# Altium footprint library Connectors SMD.PcbLib: 130 footprints (part 10 of 12)
Each footprint in its own frame and in the unit in brackets; x right, y up, seen from the top. Pads: shape width x height; smd on the part's side, far side on the other; paste and mask are expansions set on the pad; w line width, h text height; cw(c..) or ccw(c..) is an arc to the next point about the centre after c.
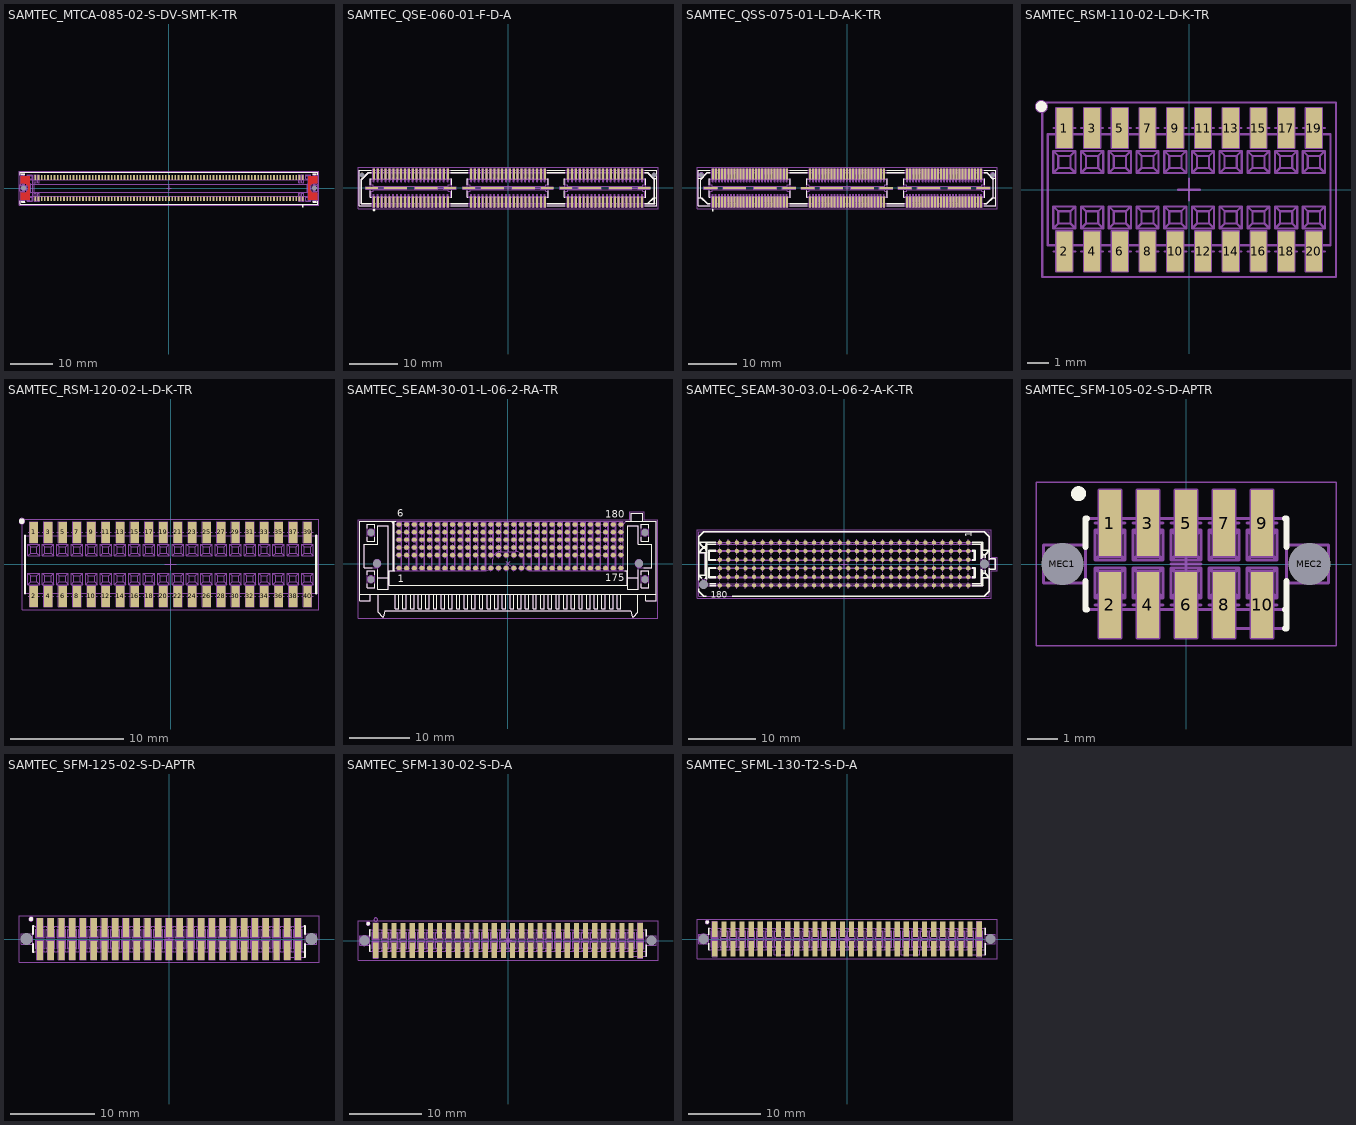
[diagram p9: the footprints below, top view; thin cyan lines are the x and y axes]

## SAMTEC_MTCA-085-02-S-DV-SMT-K-TR [mm] "170 Contacts, Pitch 0.75mm, Micro TCA Connector"
height 12.85
pads (172):
  rect 0.4x1.15 smd mask+0: 1(31.5,-2.5) 2(30.75,-2.5) 3(30,-2.5) 4(29.25,-2.5) 5(28.5,-2.5) 6(27.75,-2.5) 7(27,-2.5) 8(26.25,-2.5) 9(25.5,-2.5) 10(24.75,-2.5) 11(24,-2.5) 12(23.25,-2.5) 13(22.5,-2.5) 14(21.75,-2.5) 15(21,-2.5) 16(20.25,-2.5) 17(19.5,-2.5) 18(18.75,-2.5) 19(18,-2.5) 20(17.25,-2.5) 21(16.5,-2.5) 22(15.75,-2.5) 23(15,-2.5) 24(14.25,-2.5) 25(13.5,-2.5) 26(12.75,-2.5) 27(12,-2.5) 28(11.25,-2.5) 29(10.5,-2.5) 30(9.75,-2.5) 31(9,-2.5) 32(8.25,-2.5) 33(7.5,-2.5) 34(6.75,-2.5) 35(6,-2.5) 36(5.25,-2.5) 37(4.5,-2.5) 38(3.75,-2.5) 39(3,-2.5) 40(2.25,-2.5) 41(1.5,-2.5) 42(0.75,-2.5) 43(0,-2.5) 44(-0.75,-2.5) 45(-1.5,-2.5) 46(-2.25,-2.5) 47(-3,-2.5) 48(-3.75,-2.5) 49(-4.5,-2.5) 50(-5.25,-2.5) 51(-6,-2.5) 52(-6.75,-2.5) 53(-7.5,-2.5) 54(-8.25,-2.5) 55(-9,-2.5) 56(-9.75,-2.5) 57(-10.5,-2.5) 58(-11.25,-2.5) 59(-12,-2.5) 60(-12.75,-2.5) 61(-13.5,-2.5) 62(-14.25,-2.5) 63(-15,-2.5) 64(-15.75,-2.5) 65(-16.5,-2.5) 66(-17.25,-2.5) 67(-18,-2.5) 68(-18.75,-2.5) 69(-19.5,-2.5) 70(-20.25,-2.5) 71(-21,-2.5) 72(-21.75,-2.5) 73(-22.5,-2.5) 74(-23.25,-2.5) 75(-24,-2.5) 76(-24.75,-2.5) 77(-25.5,-2.5) 78(-26.25,-2.5) 79(-27,-2.5) 80(-27.75,-2.5) 81(-28.5,-2.5) 82(-29.25,-2.5) 83(-30,-2.5) 84(-30.75,-2.5) 85(-31.5,-2.5) 86(-31.5,2.5) 87(-30.75,2.5) 88(-30,2.5) 89(-29.25,2.5) 90(-28.5,2.5) 91(-27.75,2.5) 92(-27,2.5) 93(-26.25,2.5) 94(-25.5,2.5) 95(-24.75,2.5) 96(-24,2.5) 97(-23.25,2.5) 98(-22.5,2.5) 99(-21.75,2.5) 100(-21,2.5) 101(-20.25,2.5) 102(-19.5,2.5) 103(-18.75,2.5) 104(-18,2.5) 105(-17.25,2.5) 106(-16.5,2.5) 107(-15.75,2.5) 108(-15,2.5) 109(-14.25,2.5) 110(-13.5,2.5) 111(-12.75,2.5) 112(-12,2.5) 113(-11.25,2.5) 114(-10.5,2.5) 115(-9.75,2.5) 116(-9,2.5) 117(-8.25,2.5) 118(-7.5,2.5) 119(-6.75,2.5) 120(-6,2.5) 121(-5.25,2.5) 122(-4.5,2.5) 123(-3.75,2.5) 124(-3,2.5) 125(-2.25,2.5) 126(-1.5,2.5) 127(-0.75,2.5) 128(0,2.5) 129(0.75,2.5) 130(1.5,2.5) 131(2.25,2.5) 132(3,2.5) 133(3.75,2.5) 134(4.5,2.5) 135(5.25,2.5) 136(6,2.5) 137(6.75,2.5) 138(7.5,2.5) 139(8.25,2.5) 140(9,2.5) 141(9.75,2.5) 142(10.5,2.5) 143(11.25,2.5) 144(12,2.5) 145(12.75,2.5) 146(13.5,2.5) 147(14.25,2.5) 148(15,2.5) 149(15.75,2.5) 150(16.5,2.5) 151(17.25,2.5) 152(18,2.5) 153(18.75,2.5) 154(19.5,2.5) 155(20.25,2.5) 156(21,2.5) 157(21.75,2.5) 158(22.5,2.5) 159(23.25,2.5) 160(24,2.5) 161(24.75,2.5) 162(25.5,2.5) 163(26.25,2.5) 164(27,2.5) 165(27.75,2.5) 166(28.5,2.5) 167(29.25,2.5) 168(30,2.5) 169(30.75,2.5) 170(31.5,2.5)
  round 1 hole 1.2 unplated mask+0.1: 171(-34.25,0) 172(34.25,0)
Top Layer:
  region: -34.9,-2.75 -34.9,-1.1 -34.25,-1.109 -33.963,-1.072 -33.695,-0.961 -33.465,-0.785 -33.289,-0.555 -33.178,-0.287 -33.14,0 -33.178,0.287 -33.289,0.555 -33.465,0.785 -33.695,0.961 -33.963,1.072 -34.25,1.109 -34.25,1.1 -34.9,1.1 -34.9,2.75 -32.85,2.75 -32.85,-2.75
  region: 34.9,2.75 34.9,1.1 34.25,1.109 33.963,1.072 33.695,0.961 33.466,0.785 33.289,0.555 33.178,0.287 33.141,0 33.178,-0.287 33.289,-0.555 33.466,-0.785 33.695,-0.961 33.963,-1.072 34.25,-1.109 34.25,-1.1 34.9,-1.1 34.9,-2.75 32.85,-2.75 32.85,2.75
Top Overlay:
  circle w0.25: c31.525,-4.3 r0.125
  lines w0.2: -35,-3.15 -35,-3.75 35,-3.75 35,-3.15 ; -35,3.15 -35,3.75 35,3.75 35,3.15 ; -34.75,-3.15 -34.75,-3.35 ; -34.75,3.15 -34.75,3.35 ; -34.55,3.15 -34.75,3.35 ; -34.2,3.15 -34,3.35 ; -34,-3.15 -34,-3.35 ; -34,3.15 -34,3.35 ; 34,-3.15 34,-3.35 ; 34,3.15 34,3.35 ; 34.2,3.15 34,3.35 ; 34.55,3.15 34.75,3.35 ; 34.75,-3.15 34.75,-3.35 ; 34.75,3.15 34.75,3.35 ; -34.75,-3.35 -34.55,-3.15 -34.2,-3.15 -34,-3.35 ; -34.75,-3.35 -34,-3.35 ; -34.75,3.35 -34,3.35 ; 34,-3.35 34.2,-3.15 34.55,-3.15 34.75,-3.35 ; 34,-3.35 34.75,-3.35 ; 34,3.35 34.75,3.35
Mechanical 8:
  circle w0.1: c-34.25,0 r0.6
  lines w0.1: -34.75,0 -34.25,0 ; -34.25,-0.5 -34.25,0 ; -34.25,0.5 -34.25,0 ; -33.75,0 -34.25,0 ; -32.1,-3.075 -32.1,3.075 ; -0.5,0 0,0 ; 0,-0.5 0,0 ; 0,0.5 0,0 ; 0.5,0 0,0 ; 33.75,0 34.25,0 ; 34.25,-0.5 34.25,0 ; 34.25,0.5 34.25,0 ; 34.75,0 34.25,0 ; -31.7,-3.075 -31.5,-2.5 -31.3,-3.075 ; -31.7,-3.075 -31.7,-1.925 -31.3,-1.925 -31.3,-3.075 ; -31.7,-3.075 -31.3,-3.075 ; -31.7,-3.075 -31.7,3.075 ; -31.7,3.075 -31.5,2.5 -31.3,3.075 ; -31.7,3.075 -31.7,1.925 -31.3,1.925 -31.3,3.075 ; -31.7,3.075 -31.3,3.075 ; -30.95,-3.075 -30.75,-2.5 -30.55,-3.075 ; -30.95,-3.075 -30.95,-1.925 -30.55,-1.925 -30.55,-3.075 ; -30.95,-3.075 -30.55,-3.075 ; -30.95,3.075 -30.75,2.5 -30.55,3.075 ; -30.95,3.075 -30.95,1.925 -30.55,1.925 -30.55,3.075 ; -30.95,3.075 -30.55,3.075 ; 30.55,-3.075 30.75,-2.5 30.95,-3.075 ; 30.55,-3.075 30.95,-3.075 ; 30.55,-3.075 30.55,-1.925 30.95,-1.925 30.95,-3.075 ; 30.55,3.075 30.75,2.5 30.95,3.075 ; 30.55,3.075 30.95,3.075 ; 30.55,3.075 30.55,1.925 30.95,1.925 30.95,3.075 ; 31.3,-3.075 31.5,-2.5 31.7,-3.075 ; 31.3,-3.075 31.7,-3.075 ; 31.3,-3.075 31.3,-1.925 31.7,-1.925 31.7,-3.075 ; 31.3,3.075 31.5,2.5 31.7,3.075 ; 31.3,3.075 31.7,3.075 ; 31.3,3.075 31.3,1.925 31.7,1.925 31.7,3.075 ; -34.9,-2.75 -32.85,-2.75 -32.85,2.75 -34.9,2.75 -34.9,1.1 -34.25,1.1 cw(c-34.25,0) -34.25,-1.1 -34.9,-1.1 -34.9,-2.75 ; 32.85,-2.75 32.85,2.75 34.9,2.75 34.9,1.1 34.25,1.1 ccw(c34.25,0) 34.25,-1.1 34.9,-1.1 34.9,-2.75 32.85,-2.75
Mechanical 14:
  lines w0.1: -35,-0.7 -34.525,-0.7 ; -35,0.7 -34.525,0.7 ; -34.525,-3.15 -34.525,3.15 ; -34.525,-1 -34.8,-1 -35,-0.8 -35,0.8 -34.8,1 -34.525,1 ; -34.225,-3.15 -34.225,3.15 ; -33.35,-2.95 -32.205,-2.95 ; -33.35,2.95 -32.205,2.95 ; -31.705,-1.95 -33.575,-1.95 ; -31.705,1.25 -31.705,3.15 -31.295,3.15 -31.295,1.25 ; -31.7,1.25 -31.29,1.25 ; -31.7,1.95 -33.575,1.95 ; -31.295,-1.95 -30.955,-1.95 ; -31.295,1.95 -30.955,1.95 ; -30.545,-1.95 30.545,-1.95 ; -30.545,1.95 30.55,1.95 ; 30.955,-1.95 31.295,-1.95 ; 30.955,1.95 31.295,1.95 ; 31.705,-1.95 33.575,-1.95 ; 31.705,1.95 33.575,1.95 ; 32.205,-2.95 33.35,-2.95 ; 32.205,2.95 33.35,2.95 ; 34.225,-3.15 34.225,3.15 ; 34.525,-3.15 34.525,3.15 ; 34.525,-1 34.8,-1 35,-0.8 35,0.8 34.8,1 34.525,1 ; 34.525,-0.7 35,-0.7 ; 34.525,0.7 35,0.7 ; -35,-2.9 -34.75,-2.9 ; -35,-2.9 -35,-3.75 35,-3.75 35,-2.9 ; -35,-2.9 -34.8,-2.7 -34.55,-2.7 ; -35,2.9 -34.75,2.9 ; -35,2.9 -34.8,2.7 -34.55,2.7 ; -35,2.9 -35,3.75 35,3.75 35,2.9 ; -34.75,-3.35 -34.55,-3.15 ; -34.75,-3.35 -34,-3.35 ; -34.75,-3.35 -34.75,-2.9 ; -34.75,-2.9 -34.55,-2.7 ; -34.75,2.9 -34.55,2.7 ; -34.75,2.9 -34.75,3.35 ; -34.75,3.35 -34.55,3.15 ; -34.75,3.35 -34,3.35 ; -34.55,-3.15 -34.55,-2.7 ; -34.55,-3.15 -34.2,-3.15 ; -34.55,2.7 -34.55,3.15 ; -34.55,3.15 -34.2,3.15 ; -34.2,-3.15 -34,-3.35 ; -34.2,-3.15 -34.2,3.15 ; -34.2,3.15 -34,3.35 ; -34,-3.35 -34,3.35 ; -33.575,-1.95 -32.575,-0.95 ; -33.575,-1.95 -33.575,1.95 ; -33.575,1.95 -32.575,0.95 ; -32.575,-0.95 -32.575,0.95 ; -32.575,-0.95 32.575,-0.95 ; -32.575,0.95 32.575,0.95 ; 32.575,-0.95 33.575,-1.95 ; 32.575,-0.95 32.575,0.95 ; 32.575,0.95 33.575,1.95 ; 33.575,-1.95 33.575,1.95 ; 34,-3.35 34,3.35 ; 34,-3.35 34.2,-3.15 ; 34,-3.35 34.75,-3.35 ; 34,3.35 34.75,3.35 ; 34,3.35 34.2,3.15 ; 34.2,-3.15 34.55,-3.15 ; 34.2,-3.15 34.2,3.15 ; 34.2,3.15 34.55,3.15 ; 34.55,-3.15 34.75,-3.35 ; 34.55,-3.15 34.55,-2.7 ; 34.55,-2.7 34.75,-2.9 ; 34.55,-2.7 34.8,-2.7 35,-2.9 ; 34.55,2.7 34.75,2.9 ; 34.55,2.7 34.55,3.15 ; 34.55,2.7 34.8,2.7 35,2.9 ; 34.55,3.15 34.75,3.35 ; 34.75,-3.35 34.75,-2.9 ; 34.75,-2.9 35,-2.9 ; 34.75,2.9 35,2.9 ; 34.75,2.9 34.75,3.35 ; -33.35,-3.15 -32.205,-3.15 -32.205,-2.15 -33.35,-2.15 -33.35,-3.15 ; -33.35,2.15 -33.35,3.15 -32.205,3.15 -32.205,2.15 -33.35,2.15 ; -31.705,-3.15 -31.705,-1.25 -31.295,-1.25 -31.295,-3.15 -31.705,-3.15 ; -30.955,-3.15 -30.545,-3.15 -30.545,-1.25 -30.955,-1.25 -30.955,-3.15 ; -30.955,1.25 -30.955,3.15 -30.545,3.15 -30.545,1.25 -30.955,1.25 ; 30.545,-3.15 30.545,-1.25 30.955,-1.25 30.955,-3.15 30.545,-3.15 ; 30.545,1.25 30.955,1.25 30.955,3.15 30.545,3.15 30.545,1.25 ; 31.295,-3.15 31.705,-3.15 31.705,-1.25 31.295,-1.25 31.295,-3.15 ; 31.295,1.25 31.295,3.15 31.705,3.15 31.705,1.25 31.295,1.25 ; 32.205,-3.15 33.35,-3.15 33.35,-2.15 32.205,-2.15 32.205,-3.15 ; 32.205,2.15 33.35,2.15 33.35,3.15 32.205,3.15 32.205,2.15
Mechanical 15:
  lines w0.05: -35.25,-4 35.25,-4 35.25,4 -35.25,4 -35.25,-4
3D body: height 12.85, standoff -1.39, extent -35,-3.75 35,3.75

## SAMTEC_QSE-060-01-F-D-A [mm] "120 Contacts Female, Pitch 0.8mm, Straight Double Row High Speed Ground Plane Socket"
height 3.25
pads (134):
  rect 0.406x2.273 smd mask+0: 1(-27.6,-2.865) 2(-27.6,2.865) 3(-26.8,-2.865) 4(-26.8,2.865) 5(-26,-2.865) 6(-26,2.865) 7(-25.2,-2.865) 8(-25.2,2.865) 9(-24.4,-2.865) 10(-24.4,2.865) 11(-23.6,-2.865) 12(-23.6,2.865) 13(-22.8,-2.865) 14(-22.8,2.865) 15(-22,-2.865) 16(-22,2.865) 17(-21.2,-2.865) 18(-21.2,2.865) 19(-20.4,-2.865) 20(-20.4,2.865) 21(-19.6,-2.865) 22(-19.6,2.865) 23(-18.8,-2.865) 24(-18.8,2.865) 25(-18,-2.865) 26(-18,2.865) 27(-17.2,-2.865) 28(-17.2,2.865) 29(-16.4,-2.865) 30(-16.4,2.865) 31(-15.6,-2.865) 32(-15.6,2.865) 33(-14.8,-2.865) 34(-14.8,2.865) 35(-14,-2.865) 36(-14,2.865) 37(-13.2,-2.865) 38(-13.2,2.865) 39(-12.4,-2.865) 40(-12.4,2.865) 41(-7.6,-2.865) 42(-7.6,2.865) 43(-6.8,-2.865) 44(-6.8,2.865) 45(-6,-2.865) 46(-6,2.865) 47(-5.2,-2.865) 48(-5.2,2.865) 49(-4.4,-2.865) 50(-4.4,2.865) 51(-3.6,-2.865) 52(-3.6,2.865) 53(-2.8,-2.865) 54(-2.8,2.865) 55(-2,-2.865) 56(-2,2.865) 57(-1.2,-2.865) 58(-1.2,2.865) 59(-0.4,-2.865) 60(-0.4,2.865) 61(0.4,-2.865) 62(0.4,2.865) 63(1.2,-2.865) 64(1.2,2.865) 65(2,-2.865) 66(2,2.865) 67(2.8,-2.865) 68(2.8,2.865) 69(3.6,-2.865) 70(3.6,2.865) 71(4.4,-2.865) 72(4.4,2.865) 73(5.2,-2.865) 74(5.2,2.865) 75(6,-2.865) 76(6,2.865) 77(6.8,-2.865) 78(6.8,2.865) 79(7.6,-2.865) 80(7.6,2.865) 81(12.4,-2.865) 82(12.4,2.865) 83(13.2,-2.865) 84(13.2,2.865) 85(14,-2.865) 86(14,2.865) 87(14.8,-2.865) 88(14.8,2.865) 89(15.6,-2.865) 90(15.6,2.865) 91(16.4,-2.865) 92(16.4,2.865) 93(17.2,-2.865) 94(17.2,2.865) 95(18,-2.865) 96(18,2.865) 97(18.8,-2.865) 98(18.8,2.865) 99(19.6,-2.865) 100(19.6,2.865) 101(20.4,-2.865) 102(20.4,2.865) 103(21.2,-2.865) 104(21.2,2.865) 105(22,-2.865) 106(22,2.865) 107(22.8,-2.865) 108(22.8,2.865) 109(23.6,-2.865) 110(23.6,2.865) 111(24.4,-2.865) 112(24.4,2.865) 113(25.2,-2.865) 114(25.2,2.865) 115(26,-2.865) 116(26,2.865) 117(26.8,-2.865) 118(26.8,2.865) 119(27.6,-2.865) 120(27.6,2.865)
  rect 2.54x0.43 smd mask+0: 121(-28.065,0) 124(-11.935,0) 125(-8.065,0) 128(8.065,0) 129(11.935,0) 132(28.065,0)
  rect 4.699x0.432 smd mask+0: 122(-23.175,0) 123(-16.825,0) 126(-3.175,0) 127(3.175,0) 130(16.825,0) 131(23.175,0)
  round 0.5 hole 1 unplated mask+0.25: 133(-30.065,2.665) 134(30.065,2.665)
Top Overlay:
  circle w0.3: c-27.602,-4.55 r0.125
  lines w0.2: -28.321,-0.615 -28.321,-1.905 -28.205,-1.905 ; -28.321,0.615 -28.321,1.905 -28.205,1.905 ; -28.205,-3.62 -30.639,-3.62 -30.639,3.62 -28.205,3.62 ; -28.205,-3.258 -30.227,-3.258 ; -28.205,-3.112 -30.08,-3.112 ; -28.205,3.112 -28.683,3.112 ; -28.205,3.258 -28.744,3.258 ; -11.795,-3.62 -8.28,-3.62 ; -11.795,-3.258 -8.28,-3.258 ; -11.795,-3.112 -8.28,-3.112 ; -11.795,-1.905 -11.607,-1.905 -11.607,-0.615 ; -11.795,1.905 -11.607,1.905 -11.607,0.615 ; -11.795,3.112 -8.28,3.112 ; -11.795,3.258 -8.28,3.258 ; -11.795,3.62 -8.28,3.62 ; -8.396,-0.615 -8.396,-1.905 -8.28,-1.905 ; -8.396,0.615 -8.396,1.905 -8.28,1.905 ; 8.13,-3.62 11.723,-3.62 ; 8.13,-3.258 11.723,-3.258 ; 8.13,-3.112 11.723,-3.112 ; 8.13,-1.905 8.319,-1.905 8.319,-0.615 ; 8.13,1.905 8.319,1.905 8.319,0.615 ; 8.13,3.112 11.723,3.112 ; 8.13,3.258 11.723,3.258 ; 8.13,3.62 11.723,3.62 ; 11.607,-0.615 11.607,-1.905 11.723,-1.905 ; 11.607,0.615 11.607,1.905 11.723,1.905 ; 28.133,-3.62 30.639,-3.62 ; 28.133,-3.258 30.227,-3.258 ; 28.133,-3.112 30.08,-3.112 ; 28.133,-1.905 28.321,-1.905 ; 28.133,1.905 28.321,1.905 ; 28.133,3.112 28.683,3.112 ; 28.133,3.258 28.744,3.258 ; 28.133,3.62 30.639,3.62 ; 28.22,-3.62 30.639,-3.62 ; 28.22,-3.258 28.794,-3.258 ; 28.22,-3.112 28.734,-3.112 ; 28.22,-1.905 28.321,-1.905 ; 28.22,1.905 28.321,1.905 ; 28.22,3.112 28.734,3.112 ; 28.22,3.258 28.794,3.258 ; 28.22,3.62 30.639,3.62 ; 28.321,0.615 28.321,1.905 ; 28.321,0.617 28.321,1.905 ; 29.877,1.968 30.639,1.968 ; 30.084,-1.968 28.794,-3.258 ; 30.084,1.968 28.794,3.258 ; 30.131,-1.968 30.131,1.714 28.734,3.112 ; 30.639,-1.968 29.877,-1.968 28.734,-3.112 ; -30.227,-3.258 -30.227,1.775 ; -30.227,-3.258 -30.08,-3.112 ; -30.227,1.775 -30.08,1.714 ; -30.227,1.775 -28.744,3.258 ; -30.08,-3.112 -30.08,1.714 ; -30.08,1.714 -28.683,3.112 ; -28.744,3.258 -28.683,3.112 ; 28.321,-1.905 28.321,-0.614 28.321,-1.905 ; 28.683,3.112 30.08,1.714 ; 28.683,3.112 28.744,3.258 ; 28.734,-3.112 28.794,-3.258 ; 28.734,3.112 28.794,3.258 ; 28.744,3.258 30.227,1.775 ; 30.08,-3.112 30.08,1.714 ; 30.08,-3.112 30.227,-3.258 ; 30.08,1.714 30.227,1.775 ; 30.227,-3.258 30.227,1.775 ; 30.639,-3.62 30.639,3.62 ; 30.639,-3.62 30.639,3.62
Mechanical 8:
  drawing of 805 lines, arcs and shapes, not listed
Mechanical 14:
  drawing of 869 lines, arcs and shapes, not listed
Mechanical 15:
  lines w0.05: -30.889,-4.25 -30.889,4.25 30.889,4.25 30.889,-4.25 -30.889,-4.25
3D body: height 3.25, standoff -0.75, extent -30.639,-3.746 30.639,3.747

## SAMTEC_QSS-075-01-L-D-A-K-TR [mm] "150 Contacts Female, Pitch 0.635mm, Straight Double Row High Speed Socket"
height 3.63
pads (164):
  rect 0.406x2.273 smd mask+0: 1(-27.623,-2.865) 2(-27.623,2.865) 3(-26.988,-2.865) 4(-26.988,2.865) 5(-26.353,-2.865) 6(-26.353,2.865) 7(-25.718,-2.865) 8(-25.718,2.865) 9(-25.083,-2.865) 10(-25.083,2.865) 11(-24.448,-2.865) 12(-24.448,2.865) 13(-23.813,-2.865) 14(-23.813,2.865) 15(-23.178,-2.865) 16(-23.178,2.865) 17(-22.543,-2.865) 18(-22.543,2.865) 19(-21.908,-2.865) 20(-21.908,2.865) 21(-21.273,-2.865) 22(-21.273,2.865) 23(-20.638,-2.865) 24(-20.638,2.865) 25(-20.003,-2.865) 26(-20.003,2.865) 27(-19.368,-2.865) 28(-19.368,2.865) 29(-18.733,-2.865) 30(-18.733,2.865) 31(-18.098,-2.865) 32(-18.098,2.865) 33(-17.463,-2.865) 34(-17.463,2.865) 35(-16.828,-2.865) 36(-16.828,2.865) 37(-16.193,-2.865) 38(-16.193,2.865) 39(-15.558,-2.865) 40(-15.558,2.865) 41(-14.923,-2.865) 42(-14.923,2.865) 43(-14.288,-2.865) 44(-14.288,2.865) 45(-13.653,-2.865) 46(-13.653,2.865) 47(-13.018,-2.865) 48(-13.018,2.865) 49(-12.383,-2.865) 50(-12.383,2.865) 51(-7.62,-2.865) 52(-7.62,2.865) 53(-6.985,-2.865) 54(-6.985,2.865) 55(-6.35,-2.865) 56(-6.35,2.865) 57(-5.715,-2.865) 58(-5.715,2.865) 59(-5.08,-2.865) 60(-5.08,2.865) 61(-4.445,-2.865) 62(-4.445,2.865) 63(-3.81,-2.865) 64(-3.81,2.865) 65(-3.175,-2.865) 66(-3.175,2.865) 67(-2.54,-2.865) 68(-2.54,2.865) 69(-1.905,-2.865) 70(-1.905,2.865) 71(-1.27,-2.865) 72(-1.27,2.865) 73(-0.635,-2.865) 74(-0.635,2.865) 75(0,-2.865) 76(0,2.865) 77(0.635,-2.865) 78(0.635,2.865) 79(1.27,-2.865) 80(1.27,2.865) 81(1.905,-2.865) 82(1.905,2.865) 83(2.54,-2.865) 84(2.54,2.865) 85(3.175,-2.865) 86(3.175,2.865) 87(3.81,-2.865) 88(3.81,2.865) 89(4.445,-2.865) 90(4.445,2.865) 91(5.08,-2.865) 92(5.08,2.865) 93(5.715,-2.865) 94(5.715,2.865) 95(6.35,-2.865) 96(6.35,2.865) 97(6.985,-2.865) 98(6.985,2.865) 99(7.62,-2.865) 100(7.62,2.865) 101(12.383,-2.865) 102(12.383,2.865) 103(13.018,-2.865) 104(13.018,2.865) 105(13.653,-2.865) 106(13.653,2.865) 107(14.288,-2.865) 108(14.288,2.865) 109(14.923,-2.865) 110(14.923,2.865) 111(15.558,-2.865) 112(15.558,2.865) 113(16.193,-2.865) 114(16.193,2.865) 115(16.828,-2.865) 116(16.828,2.865) 117(17.463,-2.865) 118(17.463,2.865) 119(18.098,-2.865) 120(18.098,2.865) 121(18.733,-2.865) 122(18.733,2.865) 123(19.368,-2.865) 124(19.368,2.865) 125(20.003,-2.865) 126(20.003,2.865) 127(20.638,-2.865) 128(20.638,2.865) 129(21.273,-2.865) 130(21.273,2.865) 131(21.908,-2.865) 132(21.908,2.865) 133(22.543,-2.865) 134(22.543,2.865) 135(23.178,-2.865) 136(23.178,2.865) 137(23.813,-2.865) 138(23.813,2.865) 139(24.448,-2.865) 140(24.448,2.865) 141(25.083,-2.865) 142(25.083,2.865) 143(25.718,-2.865) 144(25.718,2.865) 145(26.353,-2.865) 146(26.353,2.865) 147(26.988,-2.865) 148(26.988,2.865) 149(27.623,-2.865) 150(27.623,2.865)
  rect 2.794x0.432 smd mask+0: 151(-28.065,-0.002) 154(-11.935,-0.002) 155(-8.068,-0.017) 158(8.062,-0.017) 159(11.935,0.002) 162(28.065,0.002)
  rect 4.699x0.432 smd mask+0: 152(-23.175,-0.002) 153(-16.825,-0.002) 156(-3.178,-0.017) 157(3.172,-0.017) 160(16.825,0.002) 161(23.175,0.002)
  round 0.5 hole 1 unplated mask+0.25: 163(-30,2.657) 164(30,2.657)
Top Overlay:
  circle w0.25: c-27.625,-4.55 r0.125
  lines w0.2: -30.639,-1.968 -29.877,-1.968 -28.734,-3.112 ; -30.639,1.968 -29.877,1.968 ; -30.131,-1.968 -30.131,1.714 -28.734,3.112 ; -30.084,-1.968 -28.794,-3.258 ; -30.084,1.968 -28.794,3.258 ; -28.321,-0.614 -28.321,-1.905 -28.225,-1.905 ; -28.321,0.617 -28.321,1.905 -28.225,1.905 ; -28.225,-3.62 -30.639,-3.62 -30.639,3.62 -28.225,3.62 ; -28.225,-3.258 -28.794,-3.258 ; -28.225,-3.112 -28.734,-3.112 ; -28.225,3.112 -28.734,3.112 ; -28.225,3.258 -28.794,3.258 ; -11.785,-3.62 -8.222,-3.62 ; -11.785,-3.258 -8.222,-3.258 ; -11.785,-3.112 -8.222,-3.112 ; -11.785,-1.905 -11.684,-1.905 -11.684,-0.614 ; -11.785,1.905 -11.684,1.905 -11.684,0.617 ; -11.785,3.112 -8.222,3.112 ; -11.785,3.258 -8.222,3.258 ; -11.785,3.62 -8.222,3.62 ; -8.319,-0.614 -8.319,-1.905 -8.222,-1.905 ; -8.319,0.617 -8.319,1.905 -8.222,1.905 ; 8.218,-3.62 11.78,-3.62 ; 8.218,-3.258 11.78,-3.258 ; 8.218,-3.112 11.78,-3.112 ; 8.218,-1.905 8.319,-1.905 8.319,-0.614 ; 8.218,1.905 8.319,1.905 8.319,0.617 ; 8.218,3.112 11.78,3.112 ; 8.218,3.258 11.78,3.258 ; 8.218,3.62 11.78,3.62 ; 11.684,-0.614 11.684,-1.905 11.78,-1.905 ; 11.684,0.617 11.684,1.905 11.78,1.905 ; 28.22,-3.62 30.639,-3.62 30.639,3.62 28.22,3.62 ; 28.22,-3.258 28.794,-3.258 ; 28.22,-3.112 28.734,-3.112 ; 28.22,-1.905 28.321,-1.905 28.321,-0.614 ; 28.22,1.905 28.321,1.905 28.321,0.617 ; 28.22,3.112 28.734,3.112 ; 28.22,3.258 28.794,3.258 ; 29.877,1.968 30.639,1.968 ; 30.084,-1.968 28.794,-3.258 ; 30.084,1.968 28.794,3.258 ; 30.131,-1.968 30.131,1.714 28.734,3.112 ; 30.639,-1.968 29.877,-1.968 28.734,-3.112 ; -28.794,-3.258 -28.734,-3.112 ; -28.794,3.258 -28.734,3.112 ; 28.734,-3.112 28.794,-3.258 ; 28.734,3.112 28.794,3.258
Mechanical 8:
  drawing of 986 lines, arcs and shapes, not listed
Mechanical 14:
  drawing of 842 lines, arcs and shapes, not listed
Mechanical 15:
  lines w0.05: -30.889,-4.249 30.889,-4.249 30.889,4.252 -30.889,4.252 -30.889,-4.249
3D body: height 3.63, standoff -0.75, extent -30.639,-3.746 30.639,3.747

## SAMTEC_RSM-110-02-L-D-K-TR [mm] "20 Contacts - Pitch 1.27mm - Dual Row Straight SMD Micro Socket"
height 6.1
pads (20):
  rect 0.74x1.84 smd: 1(-5.715,2.825) 2(-5.715,-2.825) 3(-4.445,2.825) 4(-4.445,-2.825) 5(-3.175,2.825) 6(-3.175,-2.825) 7(-1.905,2.825) 8(-1.905,-2.825) 9(-0.635,2.825) 10(-0.635,-2.825) 11(0.635,2.825) 12(0.635,-2.825) 13(1.905,2.825) 14(1.905,-2.825) 15(3.175,2.825) 16(3.175,-2.825) 17(4.445,2.825) 18(4.445,-2.825) 19(5.715,2.825) 20(5.715,-2.825)
Top Overlay:
  circle w0.25: c-6.767,3.811 r0.125
  circle w0.25: c-6.767,3.811 r0.125
Mechanical 8:
  drawing of 214 lines, arcs and shapes, not listed
Mechanical 14:
  drawing of 245 lines, arcs and shapes, not listed
Mechanical 15:
  lines w0.1: -6.727,-3.995 6.727,-3.995 6.727,3.995 -6.727,3.995 -6.727,-3.995
3D body: height 6.07, standoff 0, extent -6.477,-3.232 6.477,3.232

## SAMTEC_RSM-120-02-L-D-K-TR [mm] "40 Contacts - Pitch 1.27mm - Dual Row Straight SMD Micro Socket"
height 6.1
pads (40):
  rect 0.74x1.84 smd: 1(-12.065,2.825) 2(-12.065,-2.825) 3(-10.795,2.825) 4(-10.795,-2.825) 5(-9.525,2.825) 6(-9.525,-2.825) 7(-8.255,2.825) 8(-8.255,-2.825) 9(-6.985,2.825) 10(-6.985,-2.825) 11(-5.715,2.825) 12(-5.715,-2.825) 13(-4.445,2.825) 14(-4.445,-2.825) 15(-3.175,2.825) 16(-3.175,-2.825) 17(-1.905,2.825) 18(-1.905,-2.825) 19(-0.635,2.825) 20(-0.635,-2.825) 21(0.635,2.825) 22(0.635,-2.825) 23(1.905,2.825) 24(1.905,-2.825) 25(3.175,2.825) 26(3.175,-2.825) 27(4.445,2.825) 28(4.445,-2.825) 29(5.715,2.825) 30(5.715,-2.825) 31(6.985,2.825) 32(6.985,-2.825) 33(8.255,2.825) 34(8.255,-2.825) 35(9.525,2.825) 36(9.525,-2.825) 37(10.795,2.825) 38(10.795,-2.825) 39(12.065,2.825) 40(12.065,-2.825)
Top Overlay:
  circle w0.25: c-13.117,3.811 r0.125
  circle w0.25: c-13.117,3.811 r0.125
  lines w0.2: -12.827,-2.54 -12.827,2.54 ; 12.827,-2.54 12.827,2.54
Mechanical 8:
  drawing of 324 lines, arcs and shapes, not listed
Mechanical 14:
  drawing of 485 lines, arcs and shapes, not listed
Mechanical 15:
  lines w0.05: -13.077,-3.995 13.077,-3.995 13.077,3.995 -13.077,3.995 -13.077,-3.995
3D body: height 6.07, standoff 0, extent -12.827,-3.232 12.827,3.232

## SAMTEC_SEAM-30-01-L-06-2-RA-TR [mm] "180 Contacts in 6 rows  (30 Pin per Row), Hi-Density Right Angle Open Pin Field Connector"
height 10.59
pads (186):
  rrect100% 0.84x0.64 smd: 1(-18.085,-0.762) 2(-18.085,1.397) 3(-18.085,2.667) 4(-18.085,3.937) 5(-18.085,5.207) 6(-18.085,6.477) 7(-16.815,-0.762) 8(-16.815,1.397) 9(-16.815,2.667) 10(-16.815,3.937) 11(-16.815,5.207) 12(-16.815,6.477) 13(-15.545,-0.762) 14(-15.545,1.397) 15(-15.545,2.667) 16(-15.545,3.937) 17(-15.545,5.207) 18(-15.545,6.477) 19(-14.275,-0.762) 20(-14.275,1.397) 21(-14.275,2.667) 22(-14.275,3.937) 23(-14.275,5.207) 24(-14.275,6.477) 25(-13.005,-0.762) 26(-13.005,1.397) 27(-13.005,2.667) 28(-13.005,3.937) 29(-13.005,5.207) 30(-13.005,6.477) 31(-11.735,-0.762) 32(-11.735,1.397) 33(-11.735,2.667) 34(-11.735,3.937) 35(-11.735,5.207) 36(-11.735,6.477) 37(-10.465,-0.762) 38(-10.465,1.397) 39(-10.465,2.667) 40(-10.465,3.937) 41(-10.465,5.207) 42(-10.465,6.477) 43(-9.195,-0.762) 44(-9.195,1.397) 45(-9.195,2.667) 46(-9.195,3.937) 47(-9.195,5.207) 48(-9.195,6.477) 49(-7.925,-0.762) 50(-7.925,1.397) 51(-7.925,2.667) 52(-7.925,3.937) 53(-7.925,5.207) 54(-7.925,6.477) 55(-6.655,-0.762) 56(-6.655,1.397) 57(-6.655,2.667) 58(-6.655,3.937) 59(-6.655,5.207) 60(-6.655,6.477) 61(-5.385,-0.762) 62(-5.385,1.397) 63(-5.385,2.667) 64(-5.385,3.937) 65(-5.385,5.207) 66(-5.385,6.477) 67(-4.115,-0.762) 68(-4.115,1.397) 69(-4.115,2.667) 70(-4.115,3.937) 71(-4.115,5.207) 72(-4.115,6.477) 73(-2.845,-0.762) 74(-2.845,1.397) 75(-2.845,2.667) 76(-2.845,3.937) 77(-2.845,5.207) 78(-2.845,6.477) 79(-1.575,-0.762) 80(-1.575,1.397) 81(-1.575,2.667) 82(-1.575,3.937) 83(-1.575,5.207) 84(-1.575,6.477) 85(-0.305,-0.762) 86(-0.305,1.397) 87(-0.305,2.667) 88(-0.305,3.937) 89(-0.305,5.207) 90(-0.305,6.477) 91(0.965,-0.762) 92(0.965,1.397) 93(0.965,2.667) 94(0.965,3.937) 95(0.965,5.207) 96(0.965,6.477) 97(2.235,-0.762) 98(2.235,1.397) 99(2.235,2.667) 100(2.235,3.937) 101(2.235,5.207) 102(2.235,6.477) 103(3.505,-0.762) 104(3.505,1.397) 105(3.505,2.667) 106(3.505,3.937) 107(3.505,5.207) 108(3.505,6.477) 109(4.775,-0.762) 110(4.775,1.397) 111(4.775,2.667) 112(4.775,3.937) 113(4.775,5.207) 114(4.775,6.477) 115(6.045,-0.762) 116(6.045,1.397) 117(6.045,2.667) 118(6.045,3.937) 119(6.045,5.207) 120(6.045,6.477) 121(7.315,-0.762) 122(7.315,1.397) 123(7.315,2.667) 124(7.315,3.937) 125(7.315,5.207) 126(7.315,6.477) 127(8.585,-0.762) 128(8.585,1.397) 129(8.585,2.667) 130(8.585,3.937) 131(8.585,5.207) 132(8.585,6.477) 133(9.855,-0.762) 134(9.855,1.397) 135(9.855,2.667) 136(9.855,3.937) 137(9.855,5.207) 138(9.855,6.477) 139(11.125,-0.762) 140(11.125,1.397) 141(11.125,2.667) 142(11.125,3.937) 143(11.125,5.207) 144(11.125,6.477) 145(12.395,-0.762) 146(12.395,1.397) 147(12.395,2.667) 148(12.395,3.937) 149(12.395,5.207) 150(12.395,6.477) 151(13.665,-0.762) 152(13.665,1.397) 153(13.665,2.667) 154(13.665,3.937) 155(13.665,5.207) 156(13.665,6.477) 157(14.935,-0.762) 158(14.935,1.397) 159(14.935,2.667) 160(14.935,3.937) 161(14.935,5.207) 162(14.935,6.477) 163(16.205,-0.762) 164(16.205,1.397) 165(16.205,2.667) 166(16.205,3.937) 167(16.205,5.207) 168(16.205,6.477) 169(17.475,-0.762) 170(17.475,1.397) 171(17.475,2.667) 172(17.475,3.937) 173(17.475,5.207) 174(17.475,6.477) 175(18.745,-0.762) 176(18.745,1.397) 177(18.745,2.667) 178(18.745,3.937) 179(18.745,5.207) 180(18.745,6.477)